# Altium footprint library XTIDA-010086.PcbLib: 88 footprints (part 2 of 6)
Each footprint in its own frame and in the unit in brackets; x right, y up, seen from the top. Pads: shape width x height; smd on the part's side, far side on the other; paste and mask are expansions set on the pad; w line width, h text height; cw(c..) or ccw(c..) is an arc to the next point about the centre after c.
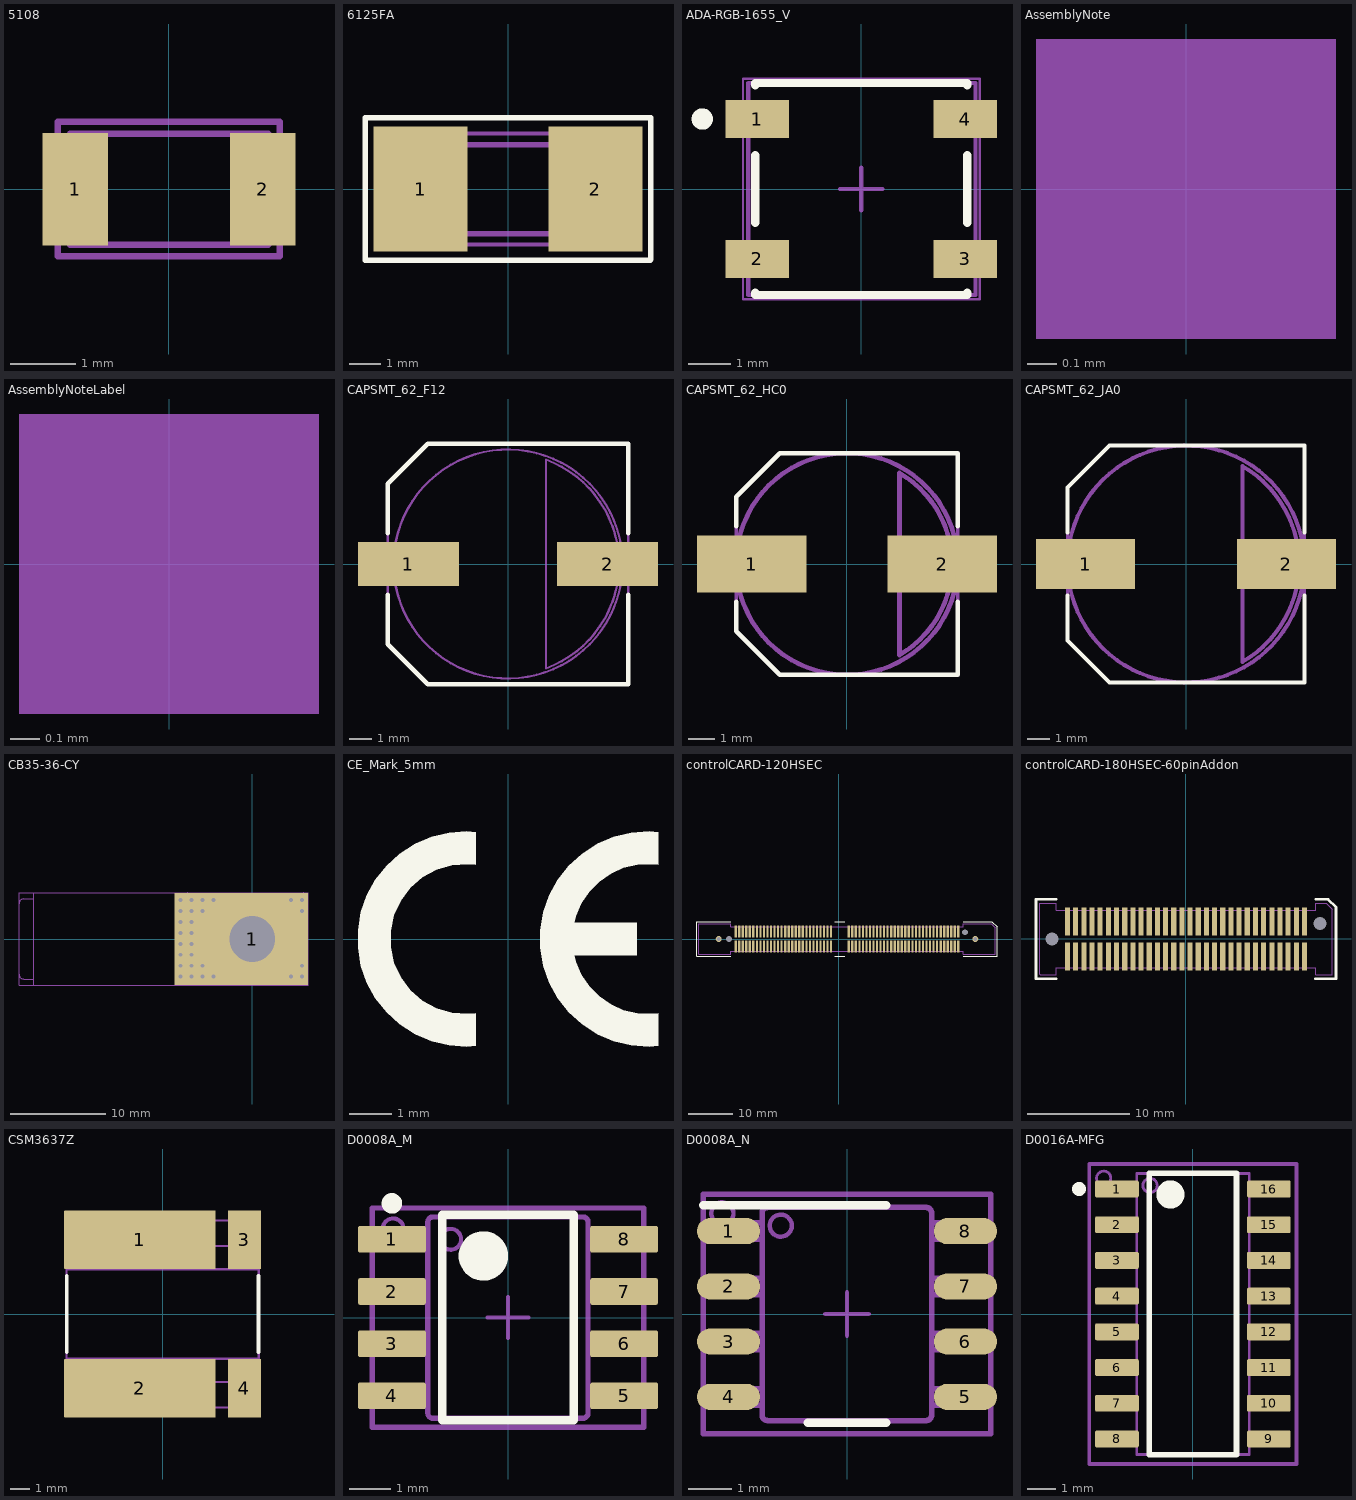
[diagram p1: the footprints below, top view; thin cyan lines are the x and y axes]

## 5108 [mm] "Keystone"
height 0.84
pads (2):
  rect 1.01x1.73 smd: 1(-1.445,0) 2(1.445,0)
Mechanical 5:
  lines w0.1: -1.717,-1.037 -1.717,1.042 1.704,1.042 1.704,-1.037 -1.717,-1.037
  text ".Designator" at -2.249,-0.15 h0.45
Mechanical 13:
  lines w0.1: -1.525,-0.856 -1.525,0.856 1.527,0.856 1.527,-0.856 -1.525,-0.856
3D body "5108.stp": height 0.71, standoff 0, extent -1.524,-0.85 1.524,0.852

## 6125FA [mm] "Cooper Bussman 6125FA Brick Fuses, recommended land pattern OC-2531 Rev. I 3/07"
height 2.84
pads (2):
  rect 3x4 smd: 1(-2.8,0) 2(2.8,0)
Top Overlay:
  lines w0.178: -4.575,-2.275 -4.575,2.275 4.575,2.275 4.575,-2.25 4.55,-2.275 -4.575,-2.275
Mechanical 5:
  lines w0.127: -3.556,-1.778 -3.556,1.778 3.556,1.778 3.556,-1.778 -3.556,-1.778
  text ".Designator" at -2.999,-0.2 h0.6
Mechanical 13:
  lines w0.178: -1.825,-1.425 -1.825,1.415 ; 1.825,-1.425 1.825,1.415 ; -3.175,-1.425 -3.175,1.415 3.175,1.415 3.175,-1.425 -3.175,-1.425
3D body: height 2.84, standoff 0, extent 1.826,-1.424 3.174,1.414
3D body: height 2.84, standoff 0, extent -1.824,-1.424 1.824,1.414
3D body: height 2.84, standoff 0, extent -3.174,-1.424 -1.826,1.414

## ADA-RGB-1655_V [mm] "SMD, 4-Leads, Body 5x5mm"
height 0.6
pads (4):
  rect 1.5x0.9 smd: 1(-2.45,1.65) 2(-2.45,-1.65) 3(2.45,-1.65) 4(2.45,1.65)
Top Overlay:
  circle w0.25: c-3.75,1.65 r0.125
  lines w0.2: -2.5,-2.45 -2.5,-2.5 2.5,-2.5 2.5,-2.45 ; -2.5,-0.8 -2.5,0.8 ; -2.5,2.45 -2.5,2.5 2.5,2.5 2.5,2.45 ; 2.5,-0.8 2.5,0.8
Mechanical 5:
  lines w0.05: -2.794,-2.6 2.794,-2.6 2.794,2.6 -2.794,2.6 -2.794,-2.6
  text ".Designator" at -3.749,-0.25 h0.75
Mechanical 13:
  lines w0.1: -2.669,-2.5 2.694,-2.5 2.694,2.5 -2.669,2.5 -2.669,-2.5
Mechanical 15:
  lines w0.1: -0.5,0 0.5,0 ; 0,-0.5 0,0.5
3D body "User Library-WS2812B.STEP": height 1.68, standoff -0.02, extent -2.7,-2.5 2.7,2.5

## AssemblyNote [mm] "Assembly Note"
height 1.75
Mechanical 5:
  rectangle: -0.508,-0.508 0.508,0.508
  text ".Comment" at 1.143,-0.508 h0.46
  text ".Designator" at -2.337,-0.229 h0.46

## AssemblyNoteLabel [mm] "Assembly Note for PCB Labels"
height 1.75
Mechanical 5:
  rectangle: -0.508,-0.508 0.508,0.508
  text ".Designator" at -2.286,-0.254 h0.46
  text "Install label in silkscreened box after final wash.  Text shall be 8 pt font.  Text shall be per the Label Table in the PDF schematic." at 1.143,-0.508 h0.46

## CAPSMT_62_F12 [mm] "F12, SMD, 2-Leads, Body 10.5x10.5mm, Height 12.7mm"
height 12.7
pads (2):
  rect 4.4x1.9 smd: 1(-4.35,0) 2(4.35,0)
Top Overlay:
  lines w0.2: -5.252,1.348 -5.252,3.498 ; -5.25,-1.35 -5.25,-3.5 -3.5,-5.25 5.25,-5.25 5.25,-1.35 ; -5.25,3.5 -3.5,5.25 5.25,5.25 5.25,1.35
Mechanical 5:
  circle w0.1: c0,0 r5
  lines w0.1: -5.25,-3.5 -5.25,3.5 -3.5,5.25 5.25,5.25 5.25,-5.25 -3.5,-5.25 -5.25,-3.5 ; 1.659,-4.558 ccw(c0,0) 1.659,4.558 1.659,-4.558
  text "+" at -4.234,-0.24 h0.46
  text ".Designator" at -4.998,-0.333 h1
3D body: height 12.71, standoff 12.7, extent 1.658,-4.558 4.851,4.558
3D body: height 12.7, standoff 1, extent -4.999,-4.999 4.999,4.999
3D body: height 1, standoff 0, extent -5.251,-5.251 5.251,5.251

## CAPSMT_62_HC0 [mm] "8 x 12mm:  Chemi-Con HC0"
height 12.5
pads (2):
  rect 4.2x2.2 smd: 1(-3.638,0.012) 2(3.662,0.012)
Top Overlay:
  lines w0.178: -4.238,-1.438 -4.238,-2.563 -2.563,-4.238 0.012,-4.238 4.262,-4.238 4.262,-1.438 ; -4.238,1.462 -4.238,2.587 -2.563,4.262 0.012,4.262 4.262,4.262 4.262,1.462
Mechanical 5:
  lines w0.127: -4.238,-2.563 -4.238,2.587 -2.563,4.262 0.012,4.262 4.262,4.262 4.262,-4.238 0.012,-4.238 -2.563,-4.238 -4.238,-2.563
  text ".Designator" at -4.998,-0.333 h1
Mechanical 13:
  circle w0.178: c0.012,0.012 r4.25
  lines w0.178: 2.025,-3.474 ccw(c0.012,0.012) 2.025,3.498 2.025,-3.474
3D body: height 1, standoff 0, extent -4.238,-4.238 4.263,4.263
3D body: height 12.5, standoff 1, extent -4.237,-4.237 4.262,4.262
3D body: height 12.5, standoff 12.4, extent 2.024,-3.474 4.038,3.499

## CAPSMT_62_JA0 [mm] "10 x 10mm:  Chemi-Con JA0"
height 10.5
pads (2):
  rect 4.4x2.2 smd: 1(-4.45,0) 2(4.45,0)
Top Overlay:
  lines w0.178: -5.25,-1.4 -5.25,-3.4 -3.4,-5.25 0,-5.25 5.25,-5.25 5.25,-1.4 ; -5.25,1.4 -5.25,3.4 -3.4,5.25 0,5.25 5.25,5.25 5.25,1.4
Mechanical 5:
  lines w0.127: -5.25,-3.4 -5.25,3.4 -3.4,5.25 0,5.25 5.25,5.25 5.25,-5.25 0,-5.25 -3.4,-5.25 -5.25,-3.4
  text ".Designator" at -4.998,-0.333 h1
Mechanical 13:
  circle w0.178: c0,0 r5.25
  lines w0.178: 2.505,-4.339 ccw(c0,0) 2.505,4.339 2.505,-4.339
3D body: height 1, standoff 0, extent -5.251,-5.251 5.251,5.251
3D body: height 10.5, standoff 1, extent -5.249,-5.249 5.249,5.249
3D body: height 10.5, standoff 10.4, extent 2.505,-4.34 5.011,4.34

## CB35-36-CY [mil] "Terminal 50A Lug"
height 750
pads (1):
  rect 550x380 hole 188 copper offset -45,0 paste-190: 1(0,0)
via 160,-155 diameter 32 hole 16
via 205,-155 diameter 32 hole 16
via 205,-110 diameter 32 hole 16
via 160,160 diameter 32 hole 16
via 205,160 diameter 32 hole 16
via 205,115 diameter 32 hole 16
via -160,160 diameter 32 hole 16
via -295,-20 diameter 32 hole 16
via -250,160 diameter 32 hole 16
via -250,115 diameter 32 hole 16
via -295,160 diameter 32 hole 16
via -205,160 diameter 32 hole 16
via -250,70 diameter 32 hole 16
via -295,115 diameter 32 hole 16
via -205,115 diameter 32 hole 16
via -250,25 diameter 32 hole 16
via -250,-20 diameter 32 hole 16
via -295,25 diameter 32 hole 16
via -295,70 diameter 32 hole 16
via -295,-65 diameter 32 hole 16
via -250,-65 diameter 32 hole 16
via -295,-110 diameter 32 hole 16
via -250,-110 diameter 32 hole 16
via -205,-110 diameter 32 hole 16
via -295,-155 diameter 32 hole 16
via -250,-155 diameter 32 hole 16
via -205,-155 diameter 32 hole 16
via -160,-155 diameter 32 hole 16
Mechanical 5:
  lines w5: -960,-190 230,-190 230,190 -960,190 -960,-190
  text ".Designator" at -160.32,-295.18 h59.06
Mechanical 13:
  lines w5: -900,-164.84 -940.4,-164.84 cw(c-940.4,-144.84) -960.4,-144.84 -960.4,144.84 cw(c-940.4,144.84) -940.4,164.84 -900,164.84 ; -285.4,-170 ccw(c-265.4,-170) -265.4,-190 -200.4,-190 209.6,-190 ccw(c209.6,-170) 229.6,-170 229.6,170 ccw(c209.6,170) 209.6,190 -200.4,190 -265.4,190 ccw(c-265.4,170) -285.4,170 ; -285.4,-170 -285.4,-190 -900,-190 -900,-170 -900,170 -900,190 -285.4,190 -285.4,170 ; -285.4,-170 -285.4,170
3D body "CB35-36-CY.STEP": height 614.43, standoff 0, extent -960,-189 230,191

## CE_Mark_5mm [mm] "Minimum text height for CE Mark"
height 19.05
Top Overlay:
  region: 3.5,-1.732 3.337,-1.748 3.01,-1.733 2.691,-1.658 2.392,-1.525 2.123,-1.339 1.894,-1.106 1.712,-0.834 1.583,-0.533 1.541,-0.375 3,-0.375 3,0.375 1.541,0.375 1.583,0.533 1.712,0.834 1.894,1.106 2.123,1.339 2.392,1.525 2.691,1.658 3.01,1.733 3.337,1.748 3.5,1.732 3.5,2.487 3.292,2.508 2.874,2.48 2.467,2.383 2.081,2.22 1.728,1.994 1.418,1.714 1.158,1.385 0.957,1.018 0.82,0.622 0.75,0.209 0.75,-0.209 0.82,-0.622 0.957,-1.018 1.158,-1.385 1.418,-1.714 1.728,-1.994 2.081,-2.22 2.467,-2.383 2.874,-2.48 3.292,-2.508 3.5,-2.487
  region: -0.75,-2.487 -0.958,-2.508 -1.376,-2.48 -1.783,-2.383 -2.169,-2.22 -2.522,-1.994 -2.832,-1.714 -3.092,-1.385 -3.293,-1.018 -3.43,-0.622 -3.5,-0.209 -3.5,0.209 -3.43,0.622 -3.293,1.018 -3.092,1.385 -2.832,1.714 -2.522,1.994 -2.169,2.22 -1.783,2.383 -1.376,2.48 -0.958,2.508 -0.75,2.487 -0.75,1.732 -0.937,1.749 -1.31,1.722 -1.669,1.617 -1.998,1.438 -2.281,1.193 -2.505,0.893 -2.66,0.553 -2.74,0.187 -2.74,-0.187 -2.66,-0.553 -2.505,-0.893 -2.281,-1.193 -1.998,-1.438 -1.669,-1.617 -1.31,-1.722 -0.937,-1.749 -0.75,-1.732

## controlCARD-120HSEC [mm] "Pads are not numbered according to Samtec datasheet."
height 7.13
pads (124):
  rect 0.5x2.724 smd: 1(-23.357,-1.678) 2(-23.357,1.722) 3(-22.557,-1.678) 4(-22.557,1.722) 5(-21.757,-1.678) 6(-21.757,1.722) 7(-20.957,-1.678) 8(-20.957,1.722) 9(-20.157,-1.678) 10(-20.157,1.722) 11(-19.357,-1.678) 12(-19.357,1.722) 13(-18.557,-1.678) 14(-18.557,1.722) 15(-17.757,-1.678) 16(-17.757,1.722) 17(-16.957,-1.678) 18(-16.957,1.722) 19(-16.157,-1.678) 20(-16.157,1.722) 21(-15.357,-1.678) 22(-15.357,1.722) 23(-14.557,-1.678) 24(-14.557,1.722) 25(-13.757,-1.678) 26(-13.757,1.722) 27(-12.957,-1.678) 28(-12.957,1.722) 29(-12.157,-1.678) 30(-12.157,1.722) 31(-11.357,-1.678) 32(-11.357,1.722) 33(-10.557,-1.678) 34(-10.557,1.722) 35(-9.757,-1.678) 36(-9.757,1.722) 37(-8.957,-1.678) 38(-8.957,1.722) 39(-8.157,-1.678) 40(-8.157,1.722) 41(-7.357,-1.678) 42(-7.357,1.722) 43(-6.557,-1.678) 44(-6.557,1.722) 45(-5.757,-1.678) 46(-5.757,1.722) 47(-4.957,-1.678) 48(-4.957,1.722) 49(-4.157,-1.678) 50(-4.157,1.722) 51(-3.357,-1.678) 52(-3.357,1.722) 53(-2.557,-1.678) 54(-2.557,1.722) 55(-1.757,-1.678) 56(-1.757,1.722) 57(2.243,-1.678) 58(2.243,1.722) 59(3.043,-1.678) 60(3.043,1.722) 61(3.843,-1.678) 62(3.843,1.722) 63(4.643,-1.678) 64(4.643,1.722) 65(5.443,-1.678) 66(5.443,1.722) 67(6.243,-1.678) 68(6.243,1.722) 69(7.043,-1.678) 70(7.043,1.722) 71(7.843,-1.678) 72(7.843,1.722) 73(8.643,-1.678) 74(8.643,1.722) 75(9.443,-1.678) 76(9.443,1.722) 77(10.243,-1.678) 78(10.243,1.722) 79(11.043,-1.678) 80(11.043,1.722) 81(11.843,-1.678) 82(11.843,1.722) 83(12.643,-1.678) 84(12.643,1.722) 85(13.443,-1.678) 86(13.443,1.722) 87(14.243,-1.678) 88(14.243,1.722) 89(15.043,-1.678) 90(15.043,1.722) 91(15.843,-1.678) 92(15.843,1.722) 93(16.643,-1.678) 94(16.643,1.722) 95(17.443,-1.678) 96(17.443,1.722) 97(18.243,-1.678) 98(18.243,1.722) 99(19.043,-1.678) 100(19.043,1.722) 101(19.843,-1.678) 102(19.843,1.722) 103(20.643,-1.678) 104(20.643,1.722) 105(21.443,-1.678) 106(21.443,1.722) 107(22.243,-1.678) 108(22.243,1.722) 109(23.043,-1.678) 110(23.043,1.722) 111(23.843,-1.678) 112(23.843,1.722) 113(24.643,-1.678) 114(24.643,1.722) 115(25.443,-1.678) 116(25.443,1.722) 117(26.243,-1.678) 118(26.243,1.722) 119(27.043,-1.678) 120(27.043,1.722)
  round 0.025 hole 1.27 unplated mask+0.876: 181(-24.857,0.022) 182(28.543,1.522)
  round 1.348 hole 0.84: 185(-27.207,0.022) 186(30.893,0.022)
Top Overlay:
  lines w0.254: -24.457,-3.859 -32.113,-3.859 -32.113,3.903 -24.457,3.903 ; -0.876,-3.859 1.362,-3.859 ; -0.876,3.903 1.362,3.903 ; 28.143,-3.859 35.799,-3.859 35.799,2.76 34.656,3.903 28.143,3.903
Mechanical 5:
  lines w0.1: -31.732,-3.478 -24.457,-3.478 -24.457,-2.778 28.143,-2.778 28.143,-3.478 35.418,-3.478 35.418,2.547 34.443,3.522 28.143,3.522 28.143,2.822 -24.457,2.822 -24.457,3.522 -31.732,3.522 -31.732,-3.478
  text ".Designator" at -1.1,-0.4 h1
3D body "Samtec-HSEC8-160-01-L-DV-A-BL.stp": height 12.35, standoff -1.35, extent -31.75,-3.475 35.3,3.525

## controlCARD-180HSEC-60pinAddon [mm] "Pads are not numbered according to datasheet."
height 7.13
pads (62):
  round 0.025 hole 1.27 unplated mask+0.876: 61(-13.1,0) 62(13.1,1.5)
  rect 0.5x2.724 smd: 121(-11.6,-1.7) 122(-11.6,1.7) 123(-10.8,-1.7) 124(-10.8,1.7) 125(-10,-1.7) 126(-10,1.7) 127(-9.2,-1.7) 128(-9.2,1.7) 129(-8.4,-1.7) 130(-8.4,1.7) 131(-7.6,-1.7) 132(-7.6,1.7) 133(-6.8,-1.7) 134(-6.8,1.7) 135(-6,-1.7) 136(-6,1.7) 137(-5.2,-1.7) 138(-5.2,1.7) 139(-4.4,-1.7) 140(-4.4,1.7) 141(-3.6,-1.7) 142(-3.6,1.7) 143(-2.8,-1.7) 144(-2.8,1.7) 145(-2,-1.7) 146(-2,1.7) 147(-1.2,-1.7) 148(-1.2,1.7) 149(-0.4,-1.7) 150(-0.4,1.7) 151(0.4,-1.7) 152(0.4,1.7) 153(1.2,-1.7) 154(1.2,1.7) 155(2,-1.7) 156(2,1.7) 157(2.8,-1.7) 158(2.8,1.7) 159(3.6,-1.7) 160(3.6,1.7) 161(4.4,-1.7) 162(4.4,1.7) 163(5.2,-1.7) 164(5.2,1.7) 165(6,-1.7) 166(6,1.7) 167(6.8,-1.7) 168(6.8,1.7) 169(7.6,-1.7) 170(7.6,1.7) 171(8.4,-1.7) 172(8.4,1.7) 173(9.2,-1.7) 174(9.2,1.7) 175(10,-1.7) 176(10,1.7) 177(10.8,-1.7) 178(10.8,1.7) 179(11.6,-1.7) 180(11.6,1.7)
Top Overlay:
  lines w0.254: -12.7,-3.881 -14.681,-3.881 -14.681,3.881 -12.7,3.881 ; 12.665,-3.881 14.681,-3.881 14.681,3.119 13.919,3.881 12.69,3.881
Mechanical 5:
  lines w0.1: -14.3,-3.468 -14.268,-3.5 -12.7,-3.5 -12.7,-2.8 12.7,-2.8 12.7,-3.5 14.3,-3.5 14.3,2.932 13.732,3.5 12.7,3.5 12.7,2.8 -12.7,2.8 -12.7,3.5 -14.3,3.5 -14.3,-3.468
  text ".Designator" at -1.583,-0.195 h0.46
3D body "HSEC8-130-01-L-DV-A.stp": height 7.95, standoff -1.35, extent -14.3,-3.5 14.3,3.5

## CSM3637Z [mm] "SMD, 4-Leads, Body 9.398x9.144mm"
height 0.889
pads (4):
  rrect3% 7.62x2.95 smd: 1(-1.145,3.735) 2(-1.145,-3.735)
  rrect6% 1.68x2.95 smd: 3(4.115,3.735) 4(4.115,-3.735)
Top Overlay:
  lines w0.2: -4.826,-1.9 -4.826,1.9 ; 4.826,-1.9 4.826,1.9
Mechanical 5:
  lines w0.102: -4.839,-4.712 4.839,-4.712 4.839,4.712 -4.839,4.712 -4.839,-4.712
  text ".Designator" at -3.749,-0.25 h0.75
Mechanical 13:
  lines w0.1: -4.826,-4.699 2.515,-4.699 2.515,-3.429 3.327,-3.429 3.327,-4.699 4.826,-4.699 4.826,-2.261 -4.826,-2.261 -4.826,-4.699 ; -4.826,-2.248 -4.826,2.248 4.826,2.248 4.826,-2.248 -4.826,-2.248 ; -4.826,2.261 4.826,2.261 4.826,4.699 3.327,4.699 3.327,3.429 2.515,3.429 2.515,4.699 -4.826,4.699 -4.826,2.261
  lines w0.102: 2.502,-4.712 3.34,-4.712 3.34,-3.416 2.502,-3.416 2.502,-4.712 ; 2.502,3.416 3.34,3.416 3.34,4.712 2.502,4.712 2.502,3.416
3D body "CSM3637Z.stp": height 0.89, standoff 0, extent -4.826,-4.699 4.826,4.699

## D0008A_M [mm] "SOIC, 8-Leads, Body 5x4mm, Pitch 1.27mm, IPC Low Density"
height 1.75
pads (8):
  rrect15% 1.65x0.65 smd: 1(-2.825,1.905) 2(-2.825,0.635) 3(-2.825,-0.635) 4(-2.825,-1.905) 5(2.825,-1.905) 6(2.825,-0.635) 7(2.825,0.635) 8(2.825,1.905)
Top Overlay:
  circle w0.6: c-0.6,1.5 r0.3
  circle w0.25: c-2.825,2.78 r0.125
  lines w0.2: -1.6,-2.5 1.6,-2.5 1.6,2.5 -1.6,2.5 -1.6,-2.5
Mechanical 5:
  circle w0.102: c-2.794,2.159 r0.254
  lines w0.127: -3.302,-2.667 3.302,-2.667 3.302,2.667 -3.302,2.667 -3.302,-2.667
  text ".Designator" at -2.999,-0.2 h0.6
Mechanical 13:
  circle w0.102: c-1.397,1.905 r0.254
  lines w0.127: -2.375,-2.095 -1.995,-2.095 -1.952,-2.095 -1.952,-1.715 -1.995,-1.715 -2.375,-1.715 ; -2.375,-2.095 -2.589,-2.095 -3.002,-2.095 -3.002,-1.715 -2.589,-1.715 -2.375,-1.715 ; -2.375,-2.095 -2.375,-1.715 ; -2.375,-0.825 -2.375,-0.445 ; -2.375,-0.825 -1.995,-0.825 -1.952,-0.825 -1.952,-0.445 -1.995,-0.445 -2.375,-0.445 ; -2.375,-0.825 -2.589,-0.825 -3.002,-0.825 -3.002,-0.445 -2.589,-0.445 -2.375,-0.445 ; -2.375,0.445 -2.589,0.445 -3.002,0.445 -3.002,0.825 -2.589,0.825 -2.375,0.825 ; -2.375,0.445 -1.995,0.445 -1.952,0.445 -1.952,0.825 -1.995,0.825 -2.375,0.825 ; -2.375,0.445 -2.375,0.825 ; -2.375,1.715 -1.995,1.715 -1.952,1.715 -1.952,2.095 -1.995,2.095 -2.375,2.095 ; -2.375,1.715 -2.589,1.715 -3.002,1.715 -3.002,2.095 -2.589,2.095 -2.375,2.095 ; -2.375,1.715 -2.375,2.095 ; -0.332,-2.45 -0.182,-2.45 ; -0.332,-2.45 -1.825,-2.45 -1.826,-2.45 cw(c-1.825,-2.323) -1.952,-2.324 -1.952,-2.323 -1.952,2.323 -1.952,2.324 cw(c-1.825,2.323) -1.826,2.45 -1.825,2.45 -0.332,2.45 ; -0.332,-2.45 -0.182,-2.45 ; -0.332,2.45 -0.182,2.45 ; -0.332,2.45 -0.182,2.45 ; -0.182,-2.45 0.178,-2.45 ; -0.182,2.45 0.178,2.45 ; 0.178,-2.45 0.328,-2.45 ; 0.178,-2.45 0.328,-2.45 ; 0.178,2.45 0.328,2.45 ; 0.178,2.45 0.328,2.45 ; 0.328,-2.45 1.821,-2.45 1.822,-2.45 ccw(c1.821,-2.323) 1.948,-2.324 1.948,-2.323 1.948,2.323 1.948,2.324 ccw(c1.821,2.323) 1.822,2.45 1.821,2.45 0.328,2.45 ; 2.371,-2.095 2.371,-1.715 ; 2.371,-2.095 1.991,-2.095 1.948,-2.095 1.948,-1.715 1.991,-1.715 2.371,-1.715 ; 2.371,-2.095 2.585,-2.095 2.998,-2.095 2.998,-1.715 2.585,-1.715 2.371,-1.715 ; 2.371,-0.825 2.371,-0.445 ; 2.371,-0.825 1.991,-0.825 1.948,-0.825 1.948,-0.445 1.991,-0.445 2.371,-0.445 ; 2.371,-0.825 2.585,-0.825 2.998,-0.825 2.998,-0.445 2.585,-0.445 2.371,-0.445 ; 2.371,0.445 1.991,0.445 1.948,0.445 1.948,0.825 1.991,0.825 2.371,0.825 ; 2.371,0.445 2.371,0.825 ; 2.371,0.445 2.585,0.445 2.998,0.445 2.998,0.825 2.585,0.825 2.371,0.825 ; 2.371,1.715 2.371,2.095 ; 2.371,1.715 1.991,1.715 1.948,1.715 1.948,2.095 1.991,2.095 2.371,2.095 ; 2.371,1.715 2.585,1.715 2.998,1.715 2.998,2.095 2.585,2.095 2.371,2.095
Mechanical 15:
  lines w0.1: -0.5,0 0.5,0 ; 0,-0.5 0,0.5
3D body "SOIC-8akaD0008AakaM08A.stp": height 1.63, standoff 0, extent -3,-2.45 3,2.45

## D0008A_N [mm] "SOIC, 8-Leads, Body 4.9x3.9mm, Pitch 1.27mm, IPC Medium Density"
height 1.75
pads (8):
  oval 1.45x0.6 smd: 1(-2.725,1.905) 2(-2.725,0.635) 3(-2.725,-0.635) 4(-2.725,-1.905) 5(2.725,-1.905) 6(2.725,-0.635) 7(2.725,0.635) 8(2.725,1.905)
Top Overlay:
  lines w0.2: -3.3,2.5 0.9,2.5 ; -0.9,-2.5 0.9,-2.5
Mechanical 5:
  circle w0.102: c-2.865,2.315 r0.254
  lines w0.127: -3.302,-2.75 -3.302,2.75 3.302,2.75 3.302,-2.75 -3.302,-2.75
  text ".Designator" at -2.999,-0.2 h0.6
Mechanical 13:
  circle w0.102: c-1.524,2.032 r0.254
  lines w0.127: -2.375,-2.095 -2.375,-1.715 ; -2.375,-2.095 -2.589,-2.095 -3.002,-2.095 -3.002,-1.715 -2.589,-1.715 -2.375,-1.715 ; -2.375,-2.095 -1.995,-2.095 -1.952,-2.095 -1.952,-1.715 -1.995,-1.715 -2.375,-1.715 ; -2.375,-0.825 -2.589,-0.825 -3.002,-0.825 -3.002,-0.445 -2.589,-0.445 -2.375,-0.445 ; -2.375,-0.825 -1.995,-0.825 -1.952,-0.825 -1.952,-0.445 -1.995,-0.445 -2.375,-0.445 ; -2.375,-0.825 -2.375,-0.445 ; -2.375,0.445 -2.375,0.825 ; -2.375,0.445 -1.995,0.445 -1.952,0.445 -1.952,0.825 -1.995,0.825 -2.375,0.825 ; -2.375,0.445 -2.589,0.445 -3.002,0.445 -3.002,0.825 -2.589,0.825 -2.375,0.825 ; -2.375,1.715 -2.375,2.095 ; -2.375,1.715 -2.589,1.715 -3.002,1.715 -3.002,2.095 -2.589,2.095 -2.375,2.095 ; -2.375,1.715 -1.995,1.715 -1.952,1.715 -1.952,2.095 -1.995,2.095 -2.375,2.095 ; -0.332,-2.45 -0.182,-2.45 ; -0.332,-2.45 -1.825,-2.45 -1.826,-2.45 cw(c-1.825,-2.323) -1.952,-2.324 -1.952,-2.323 -1.952,2.323 -1.952,2.324 cw(c-1.825,2.323) -1.826,2.45 -1.825,2.45 -0.332,2.45 ; -0.332,-2.45 -0.182,-2.45 ; -0.332,2.45 -0.182,2.45 ; -0.332,2.45 -0.182,2.45 ; -0.182,-2.45 0.178,-2.45 ; -0.182,2.45 0.178,2.45 ; 0.178,-2.45 0.328,-2.45 ; 0.178,-2.45 0.328,-2.45 ; 0.178,2.45 0.328,2.45 ; 0.178,2.45 0.328,2.45 ; 0.328,-2.45 1.821,-2.45 1.822,-2.45 ccw(c1.821,-2.323) 1.948,-2.324 1.948,-2.323 1.948,2.323 1.948,2.324 ccw(c1.821,2.323) 1.822,2.45 1.821,2.45 0.328,2.45 ; 2.371,-2.095 2.585,-2.095 2.998,-2.095 2.998,-1.715 2.585,-1.715 2.371,-1.715 ; 2.371,-2.095 1.991,-2.095 1.948,-2.095 1.948,-1.715 1.991,-1.715 2.371,-1.715 ; 2.371,-2.095 2.371,-1.715 ; 2.371,-0.825 2.585,-0.825 2.998,-0.825 2.998,-0.445 2.585,-0.445 2.371,-0.445 ; 2.371,-0.825 1.991,-0.825 1.948,-0.825 1.948,-0.445 1.991,-0.445 2.371,-0.445 ; 2.371,-0.825 2.371,-0.445 ; 2.371,0.445 2.585,0.445 2.998,0.445 2.998,0.825 2.585,0.825 2.371,0.825 ; 2.371,0.445 2.371,0.825 ; 2.371,0.445 1.991,0.445 1.948,0.445 1.948,0.825 1.991,0.825 2.371,0.825 ; 2.371,1.715 2.585,1.715 2.998,1.715 2.998,2.095 2.585,2.095 2.371,2.095 ; 2.371,1.715 1.991,1.715 1.948,1.715 1.948,2.095 1.991,2.095 2.371,2.095 ; 2.371,1.715 2.371,2.095
Mechanical 15:
  lines w0.1: -0.5,0 0.5,0 ; 0,-0.5 0,0.5
3D body "D0008A.stp": height 1.63, standoff 0, extent -3,-2.45 3,2.45

## D0016A-MFG [mm]
height 1.75
pads (16):
  rrect17% 1.55x0.6 smd paste-1000 mask+0: 1(-2.7,4.445) 2(-2.7,3.175) 3(-2.7,1.905) 4(-2.7,0.635) 5(-2.7,-0.635) 6(-2.7,-1.905) 7(-2.7,-3.175) 8(-2.7,-4.445) 9(2.7,-4.445) 10(2.7,-3.175) 11(2.7,-1.905) 12(2.7,-0.635) 13(2.7,0.635) 14(2.7,1.905) 15(2.7,3.175) 16(2.7,4.445)
Top Overlay:
  circle w0.5: c-0.8,4.25 r0.25
  circle w0.25: c-4.05,4.445 r0.125
  lines w0.2: -1.55,-5 -1.55,5 1.55,5 1.55,-5 ; -1.55,-5 1.55,-5 ; -1.55,-5 1.55,-5
Top Paste:
  drawing of 16 lines, arcs and shapes, not listed
Mechanical 5:
  circle w0.102: c-3.175,4.826 r0.254
  lines w0.127: -3.683,-5.334 3.683,-5.334 3.683,5.334 -3.683,5.334 -3.683,-5.334
  text ".Designator" at 0.25,-3.749 h0.75
Mechanical 13:
  circle w0.102: c-1.524,4.572 r0.254
  lines w0.1: -2,-5 2,-5 2,5 -2,5 -2,-5
3D body "IC_SN74HC148DR_SOIC16.STEP": height 0.25, standoff 0, extent -3.575,-5.25 3.575,5.25